# Altium schematic symbol library AA_Symbols.SchLib: 1017 symbols (part 4 of 7) (continued)
## IC_OPA4376AIPW
designator U?, comment OPA4376AIPW
IC, Quad Op-amp, Precision, Low Noise, Low Quiescent Current; Manufacturer: Texas Instruments; Manufacturer P/N: OPA4376AIPWR; Outset P/N: 0000143
footprint TSSOP_14PIN (TSSOP, 14-Leads, Body 5.1x4.5mm (max), Pitch 0.65mm, IPC Medium Density)
part A pins: 1 Aout, 2 -A, 3 +A
part B pins: 5 +B, 6 -B, 7 Bout
part C pins: 8 Cout, 9 -C, 10 +C
part D pins: 12 +D, 13 -D, 14 Dout
part E pins: 4 V+ (power), 11 V- (power)

## IC_PCM5100APWR
designator U?, comment PCM5100APWR
IC, Audio DAC, 16-32b, I2S, 20-TSSOP; Manufacturer: Texas Instruments; Outset P/N: PN-0008408; Manufacturer P/N: PCM5100APWR
footprint SOP20P65_650X640X120L62X24N (PW_MO-153) (Small Outline Pkg (SOP), 0.65 mm pitch; 20 pin, 6.50 mm L X 4.40 mm W X 1.20 mm H body)
pins: 1 CPVDD (power), 2 CAPP (out), 3 CPGND (power), 4 CAPM (out), 5 VNEG (out), 6 OUTL (out), 7 OUTR (out), 8 AVDD (power), 9 AGND (power), 10 DEMP (in), 11 FLT (in), 12 SCK (in), 13 BCK (in), 14 DIN (in), 15 LRCLK (in), 16 FMT (in), 17 XSMT (in), 18 LDOO (power), 19 DGND (power), 20 DVDD (power)

## IC_R3119N120A-TR-FE
designator U?, comment R3119N120A-TR-FE
IC, Supervisor Open Drain or Open Collector 1 Channel SOT-23-5; Manufacturer: Nisshinbo Micro Devices Inc.; Value: R3119N120A-TR-FE; Manufacturer P/N: R3119N120A-TR-FE
pins: 1 VDD (power) "BIAS", 2 GND (power) "VCC", 3 GND (power), 4 DOUT (out) "CH A", 5 CD (in) "CH B"

## IC_SN65HVD31DR
designator U?, comment SN65HVD31DR
IC, RS-485 Driver and Receiver, 5Mbps; Manufacturer: Texas Instruments; Value: SN65HVD31DR; Manufacturer P/N: SN65HVD31DR
footprint SOIC8P127_490X599X175L84X41N (D_MS-012AA)
pins: 1 VCC (power), 2 R (out), 3 D (in), 4 GND (power), 5 Y (out), 6 Z (out), 7 B (in), 8 A (in)

## IC_SN65HVD32DR
designator U?, comment SN65HVD32DR
IC, RS-485 Driver and Receiver; Manufacturer: Texas Instruments; Outset P/N: 0008129; Value: SN65HVD32DR; Manufacturer P/N: SN65HVD32DR
footprint SOIC8P127_490X599X175L84X41N (D_MS-012AA)
pins: 1 VCC (power), 2 R (out), 3 D (in), 4 GND (power), 5 Y (out), 6 Z (out), 7 B (in), 8 A (in)

## IC_SN65HVD33DR
designator U?, comment SN65HVD33DR
IC TRANSCEIVER FULL 1/1 14SOIC; Manufacturer: Teaxas Instruments; Outset P/N: PN-0008336; TEMPERATURE: -40°C ~ 85°C; Manufacturer P/N: SN65HVD33DR; VALUE: SN65HVD33DR
footprint SOIC14P127_865X600X175L83X41N (D_MS-012AB)
pins: 1 NC, 2 R (out), 3 ~{RE} (in), 4 DE (in), 5 D (in), 6 GND (power), 7 GND (power), 8 NC, 9 Y (out), 10 ~{Z} (out), 11 ~{B} (in), 12 A (in), 13 VCC (power), 14 VCC (power)

## IC_SN65HVD35DR
designator U?, comment SN65HVD35DR
IC, RS-485 Driver and Receiver; Manufacturer: Texas Instruments; Outset P/N: 0000146; Manufacturer P/N: SN65HVD35DR
footprint SOIC_14PIN
pins: 1 NC (in) hidden, 2 R (out), 3 /RE (in), 4 DE (in), 5 D (in), 6 GND (power), 7 GND (power), 9 Y (out), 10 Z (out), 11 B (in), 12 A (in), 13 VCC (power), 14 VCC (power)
text: RS-485 Tx/Rx; +3.3V

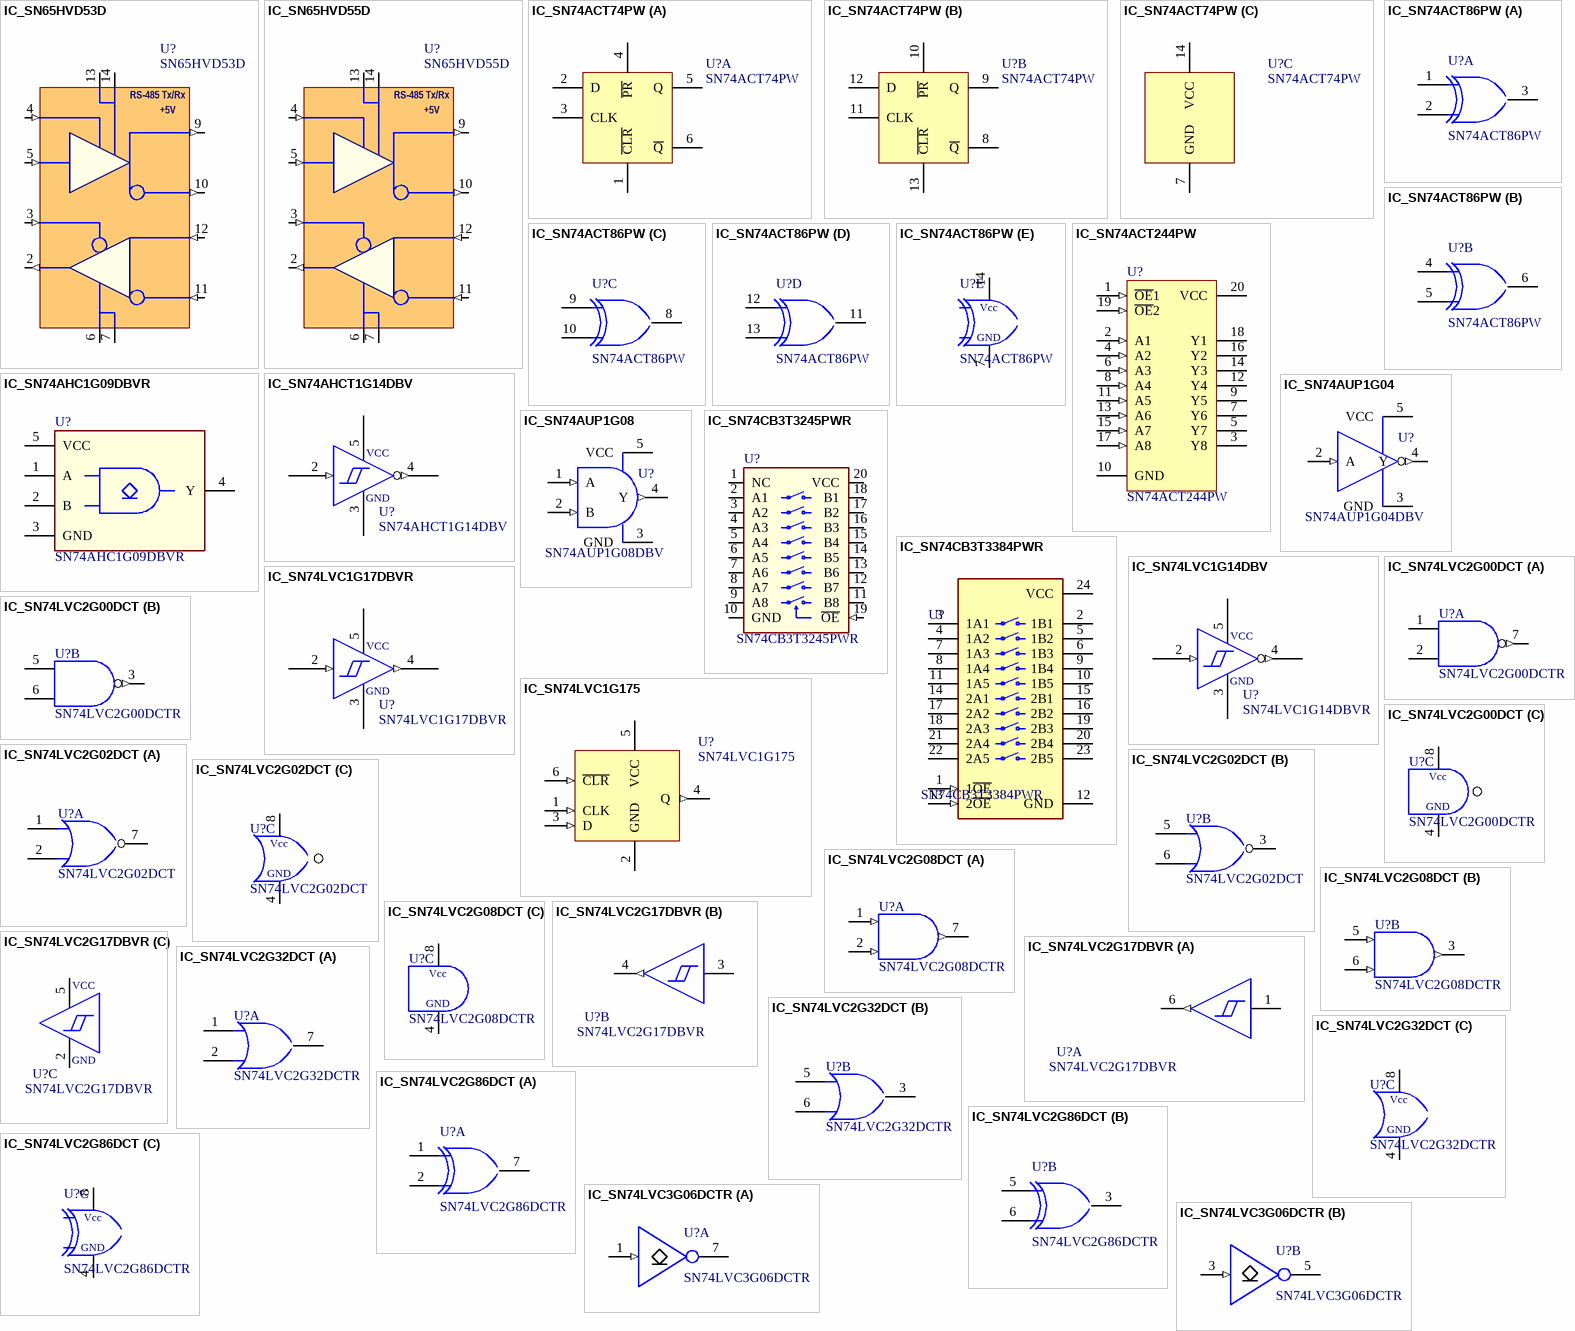
[diagram p23: symbols IC_SN65HVD53D to IC_SN74LVC3G06DCTR]

## IC_SN65HVD53D
designator U?, comment SN65HVD53D
IC, RS-485 Driver and Receiver 5V; Manufacturer: Texas Instruments; Outset P/N: 0000147; Manufacturer P/N: SN65HVD53D
footprint SOIC_14PIN
pins: 1 NC (in) hidden, 2 R (out), 3 /RE (in), 4 DE (in), 5 D (in), 6 GND (power), 7 GND (power), 9 Y (out), 10 Z (out), 11 B (in), 12 A (in), 13 VCC (power), 14 VCC (power)
text: RS-485 Tx/Rx; +5V

## IC_SN65HVD55D
designator U?, comment SN65HVD55D
IC, RS-485 Driver and Receiver 5V, 1Mbps Rate; Manufacturer: Texas Instruments; Outset P/N: PN-0005562; Manufacturer P/N: SN65HVD55D
footprint SOIC_14PIN
pins: 1 NC (in) hidden, 2 R (out), 3 /RE (in), 4 DE (in), 5 D (in), 6 GND (power), 7 GND (power), 9 Y (out), 10 Z (out), 11 B (in), 12 A (in), 13 VCC (power), 14 VCC (power)
text: RS-485 Tx/Rx; +5V

## IC_SN74ACT74PW
designator U?, comment SN74ACT74PW
IC, Flip-Flop, D-Type, Dual, Positive-Edge Triggered; Manufacturer: Texas Instruments; Manufacturer P/N: SN74ACT74PWR; Outset P/N: 0000149
footprint TSSOP_14PIN (TSSOP, 14-Leads, Body 5.1x4.5mm (max), Pitch 0.65mm, IPC Medium Density)
part A pins: 1 ~{CLR}, 2 D, 3 CLK, 4 ~{PR}, 5 Q, 6 ~{Q}
part B pins: 8 ~{Q}, 9 Q, 10 ~{PR}, 11 CLK, 12 D, 13 ~{CLR}
part C pins: 7 GND, 14 VCC

## IC_SN74ACT86PW
designator U?, comment SN74ACT86PW
IC, 2-Input XOR Gate, Quad; Manufacturer: Texas Instruments; Manufacturer P/N: SN74ACT86PWR; Outset P/N: 0000150
footprint TSSOP_14PIN (TSSOP, 14-Leads, Body 5.1x4.5mm (max), Pitch 0.65mm, IPC Medium Density)
part A pins: 1 A, 2 B, 3 Y
part B pins: 4 A, 5 B, 6 Y
part C pins: 8 Y, 9 A, 10 B
part D pins: 11 Y, 12 A, 13 B
part E pins: 7 GND (power), 14 VCC (power)
part E text: Vcc

## IC_SN74ACT244PW
designator U?, comment SN74ACT244PW
IC, Octal Buffer/Driver with 3-State Outputs; Manufacturer: Texas Instruments; Outset P/N: 0000148; Manufacturer P/N: SN74ACT244PW
footprint TSSOP_20PIN
pins: 1 ~{OE}1 (in), 2 A1 (in), 3 Y8 (hiz), 4 A2 (in), 5 Y7 (hiz), 6 A3 (in), 7 Y6 (hiz), 8 A4 (in), 9 Y5 (hiz), 10 GND (power), 11 A5 (in), 12 Y4 (hiz), 13 A6 (in), 14 Y3 (hiz), 15 A7 (in), 16 Y2 (hiz), 17 A8 (in), 18 Y1 (hiz), 19 ~{OE}2 (in), 20 VCC (power)

## IC_SN74AHC1G09DBVR
designator U?, comment SN74AHC1G09DBVR
IC, AND Gate IC 1 Channel Open Drain SOT-23-5; Manufacturer: Texas Instruments; Outset P/N: PN-0002781; Manufacturer P/N: SN74AHC1G09DBVR; Value: SN74AHC1G09DBVR
footprint SOT23_5PIN (SOT23, 5-Leads, Body 3.0x3.0mm (max), Pitch 0.95mm, IPC Medium Density)
pins: 1 A, 2 B, 3 GND (power), 4 Y, 5 VCC (power)

## IC_SN74AHCT1G14DBV
designator U?, comment SN74AHCT1G14DBV
IC, Schmitt-Trigger Inverter, ACHT; Manufacturer: Texas Instruments; Manufacturer P/N: SN74AHCT1G14DBVR; Outset P/N: 0000151
footprint SOT23_5PIN (SOT23, 5-Leads, Body 3.0x3.0mm (max), Pitch 0.95mm, IPC Medium Density)
pins: 1 NC (in) hidden, 2 A (in), 3 GND (power), 4 Y (out), 5 VCC (power)

## IC_SN74AUP1G04
designator U?, comment SN74AUP1G04DBV
IC, Single, INV, Low Power; Manufacturer: Texas Instruments; Outset P/N: PN-0002760; Manufacturer P/N: SN74AUP1G04DBV; Value: SN74AUP1G04DBV
footprint SOT23_5PIN (SOT23, 5-Leads, Body 3.0x3.0mm (max), Pitch 0.95mm, IPC Medium Density)
pins: 2 A (in), 3 GND (power), 4 Y (out), 5 VCC (power)

## IC_SN74AUP1G08
designator U?, comment SN74AUP1G08DBV
IC, Single, 2-In, AND, Low Power; Manufacturer: Texas Instruments; Outset P/N: PN-0002761; Manufacturer P/N: SN74AUP1G08DBV; Value: SN74AUP1G08DBV
footprint SOT23_5PIN (SOT23, 5-Leads, Body 3.0x3.0mm (max), Pitch 0.95mm, IPC Medium Density)
pins: 1 A (in), 2 B (in), 3 GND (power), 4 Y (out), 5 VCC (power)

## IC_SN74CB3T3245PWR
designator U?, comment SN74CB3T3245PWR
IC, Bus Switch, Octal, SN74CB3T3245PWR, 20-TSSOP; Manufacturer: Texas Instruments; Outset P/N: PN-0001788; Value: SN74CB3T3245PWR; Manufacturer P/N: SN74CB3T3245PWR
footprint SN74CB3T3245PW_SOP65P640X120-20N (SOP,0.65mm,pitch;20 pin,4.40mm W X 6.50mm L X 1.20mm H body)
pins: 1 NC, 2 A1, 3 A2, 4 A3, 5 A4, 6 A5, 7 A6, 8 A7, 9 A8, 10 GND (power), 11 B8, 12 B7, 13 B6, 14 B5, 15 B4, 16 B3, 17 B2, 18 B1, 19 ~{OE} (in), 20 VCC (power)

## IC_SN74CB3T3384PWR
designator U?, comment SN74CB3T3384PWR
IC, Bus Switch, 10-ch, 24-TSSOP; Manufacturer: Texas Instruments; Value: SN74CB3T3384PWR; Manufacturer P/N: SN74CB3T3384PWR
footprint SOP24P65_780X640X120L62X24N (PW_MO-153) (Small Outline Pkg (SOP), 0.65 mm pitch; 24 pin, 7.80 mm L X 4.40 mm W X 1.20 mm H body)
pins: 1 1~{OE} (in), 2 1B1, 3 1A1, 4 1A2, 5 1B2, 6 1B3, 7 1A3, 8 1A4, 9 1B4, 10 1B5, 11 1A5, 12 GND (power), 13 2~{OE} (in), 14 2A1, 15 2B1, 16 2B2, 17 2A2, 18 2A3, 19 2B3, 20 2B4, 21 2A4, 22 2A5, 23 2B5, 24 VCC (power)

## IC_SN74LVC1G14DBV
designator U?, comment SN74LVC1G14DBVR
IC, Schmitt-Trigger Inverter; Manufacturer: Texas Instruments; Outset P/N: 0000153; Manufacturer P/N: SN74LVC1G14DBVR
footprint SOT23_5PIN (SOT23, 5-Leads, Body 3.0x3.0mm (max), Pitch 0.95mm, IPC Medium Density)
pins: 1 NC (in) hidden, 2 A (in), 3 GND (power), 4 Y (out), 5 VCC (power)

## IC_SN74LVC1G17DBVR
designator U?, comment SN74LVC1G17DBVR
IC, Schmitt-Trigger Non-Inverting, ACHT; Manufacturer: Texas Instruments; Outset P/N: PN-0002755; Manufacturer P/N: SN74LVC1G17DBVR; Value: SN74LVC1G17DBVR
footprint SOT23_5PIN (SOT23, 5-Leads, Body 3.0x3.0mm (max), Pitch 0.95mm, IPC Medium Density)
pins: 1 NC (in) hidden, 2 A (in), 3 GND (power), 4 Y (out), 5 VCC (power)

## IC_SN74LVC1G175
designator U?, comment SN74LVC1G175
IC, Flip-Flop, D-Type, Single with Asynchronous Clear; Manufacturer: Texas Instruments; Outset P/N: PN-0004042; Manufacturer P/N: SN74LVC1G175
footprint SOT23_6PIN (Small Outline; 6 Leads; Body 3.6 x 3.6 mm, inc. leads (LxW max))
pins: 1 CLK (in), 2 GND, 3 D (in), 4 Q (out), 5 VCC, 6 ~{CLR} (in)

## IC_SN74LVC2G00DCT
designator U?, comment SN74LVC2G00DCTR
IC, 2-Input NAND Gate, Dual; Manufacturer: Texas Instruments; Outset P/N: 0000155; Manufacturer P/N: SN74LVC2G00DCTR
footprint DCT8
part A pins: 1 A, 2 B, 7 Y (out)
part B pins: 3 Y (out), 5 A, 6 B
part C pins: 4 GND (power), 8 VCC (power)
part C text: Vcc

## IC_SN74LVC2G02DCT
designator U?, comment SN74LVC2G02DCT
IC, 2-Input NOR Gate, Dual; Manufacturer: Texas Instruments; Manufacturer P/N: SN74LVC2G02DCTR; Outset P/N: 0000156
footprint DCT8
part A pins: 1 A, 2 B, 7 Y
part B pins: 3 Y, 5 A, 6 B
part C pins: 4 GND, 8 VCC
part C text: Vcc

## IC_SN74LVC2G08DCT
designator U?, comment SN74LVC2G08DCTR
IC, 2-Input AND Gate, Dual; Manufacturer: Texas Instruments; Outset P/N: 0000157; Manufacturer P/N: SN74LVC2G08DCTR
footprint DCT8
part A pins: 1 A (in), 2 B (in), 7 Y (out)
part B pins: 3 Y (out), 5 A (in), 6 B (in)
part C pins: 4 GND (power), 8 VCC (power)
part C text: Vcc

## IC_SN74LVC2G17DBVR
designator U?, comment SN74LVC2G17DBVR
IC, Dual Buffer Schmitt Trigger; Manufacturer: Texas Instruments; Outset P/N: 0000158; Manufacturer P/N: SN74LVC2G17DBVR
footprint SOT23_6PIN (Small Outline; 6 Leads; Body 3.6 x 3.6 mm, inc. leads (LxW max))
part A pins: 1 1A, 6 1Y (out)
part B pins: 3 2A, 4 2Y (out)
part C pins: 2 GND (power), 5 VCC (power)

## IC_SN74LVC2G32DCT
designator U?, comment SN74LVC2G32DCTR
IC, 2-Input OR Gate, Dual; Manufacturer: Texas Instruments; Outset P/N: 0000159; Manufacturer P/N: SN74LVC2G32DCTR
footprint DCT8
part A pins: 1 A, 2 B, 7 Y
part B pins: 3 Y, 5 A, 6 B
part C pins: 4 GND, 8 VCC
part C text: Vcc

## IC_SN74LVC2G86DCT
designator U?, comment SN74LVC2G86DCTR
IC, Dual 2-Input Exclusive-OR Gate; Manufacturer: Texas Instruments; Outset P/N: 0000160; Manufacturer P/N: SN74LVC2G86DCTR
footprint DCT8
part A pins: 1 A, 2 B, 7 Y
part B pins: 3 Y, 5 A, 6 B
part C pins: 4 GND (power), 8 VCC (power)
part C text: Vcc

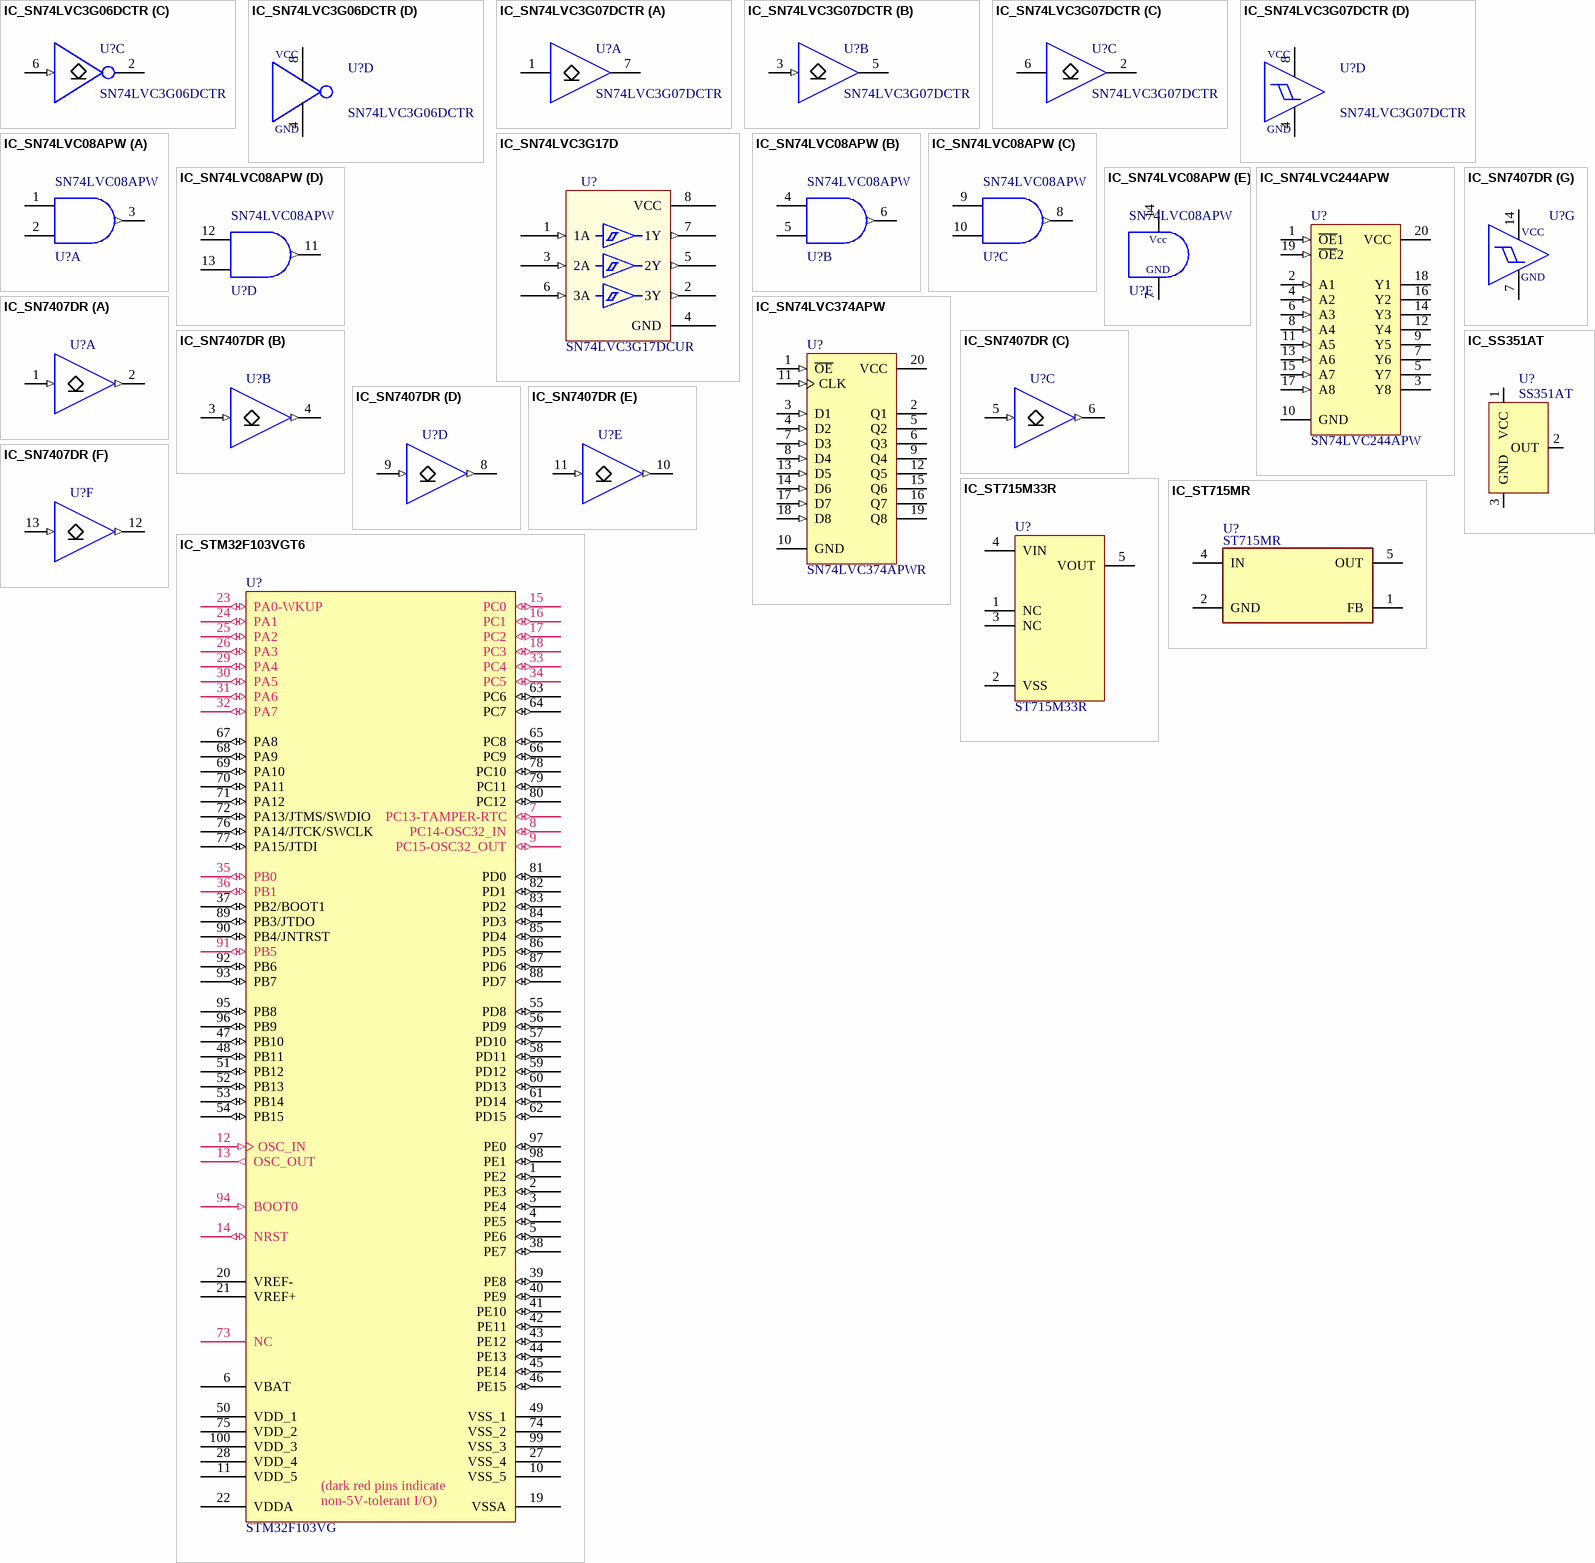
[diagram p24: symbols IC_SN74LVC3G06DCTR to IC_STM32F103VGT6]

## IC_SN74LVC3G06DCTR
designator U?, comment SN74LVC3G06DCTR
IC, Buffer, Inverting, Tri, Open Drain, SN74LVC3G06DCTR, SM8; Manufacturer: Texas Instruments; Outset P/N: PN-0001787; Manufacturer P/N: SN74LVC3G06DCTR
footprint SN74LVC3G07DCTR_SOP65P400X130-8L40N (Small Outline Pkg (SOP), 0.65 mm pitch; 8 pin, 2.95 mm L X 2.80 mm W X 1.30 mm H body)
part A pins: 1 1A (in), 7 1Y (oc)
part B pins: 3 2A (in), 5 2Y (oc)
part C pins: 2 3Y (oc), 6 3A (in)
part D pins: 4 GND (power), 8 VCC (power)
1 alternate drawing of the same symbol

## IC_SN74LVC3G07DCTR
designator U?, comment SN74LVC3G07DCTR
IC, Buffer, Tri, Open Drain, SN74LVC3G07DCTR, SM8; Manufacturer: Texas Instruments; Outset P/N: PN-0001728; Manufacturer P/N: SN74LVC3G07DCTR
footprint SN74LVC3G07DCTR_SOP65P400X130-8L40N (Small Outline Pkg (SOP), 0.65 mm pitch; 8 pin, 2.95 mm L X 2.80 mm W X 1.30 mm H body)
part A pins: 1 1A, 7 1Y (oc)
part B pins: 3 2A (in), 5 2Y (oc)
part C pins: 2 3Y (oc), 6 3A
part D pins: 4 GND (power), 8 VCC (power)
1 alternate drawing of the same symbol

## IC_SN74LVC3G17D
designator U?, comment SN74LVC3G17DCUR
IC, Triple Schmidt Trigger Buffer, SN74LVC3G17DCUR, US8; Manufacturer: TI; Outset P/N: PN-0001689; Manufacturer P/N: SN74LVC3G17DCUR; Value: SN74LVC3G17DCUR
footprint SN74LVC3G17D_SOP50P310X90-8N (MO-187CA) (SOP,0.50mm,pitch;8 pin,2.30mm W X 2.00mm L X 0.90mm H body)
pins: 1 1A (in), 2 3Y (out), 3 2A (in), 4 GND (power), 5 2Y (out), 6 3A (in), 7 1Y (out), 8 VCC (power)

## IC_SN74LVC08APW
designator U?, comment SN74LVC08APW
IC, Quadruple 2-Input Positive-AND Gate; Manufacturer: Texas Instruments; Outset P/N: 0000152; Manufacturer P/N: SN74LVC08APW
footprint TSSOP_14PIN (TSSOP, 14-Leads, Body 5.1x4.5mm (max), Pitch 0.65mm, IPC Medium Density)
part A pins: 1 A, 2 B, 3 Y (out)
part B pins: 4 A, 5 B, 6 Y (out)
part C pins: 8 Y (out), 9 A, 10 B
part D pins: 11 Y (out), 12 A, 13 B
part E pins: 7 GND (power), 14 VCC (power)
part E text: Vcc

## IC_SN74LVC244APW
designator U?, comment SN74LVC244APW
IC, Octal Buffer/Driver with 3-State Outputs; Manufacturer: Texas Instruments; Manufacturer P/N: SN74LVC244APWR; Outset P/N: 0000154
footprint TSSOP_20PIN
pins: 1 ~{OE}1 (in), 2 A1 (in), 3 Y8 (hiz), 4 A2 (in), 5 Y7 (hiz), 6 A3 (in), 7 Y6 (hiz), 8 A4 (in), 9 Y5 (hiz), 10 GND (power), 11 A5 (in), 12 Y4 (hiz), 13 A6 (in), 14 Y3 (hiz), 15 A7 (in), 16 Y2 (hiz), 17 A8 (in), 18 Y1 (hiz), 19 ~{OE}2 (in), 20 VCC (power)

## IC_SN74LVC374APW
designator U?, comment SN74LVC374APWR
IC, Octal D-Type Edge-Triggered Flip-Flop with 3-State Outputs; Manufacturer: Texas Instruments; Outset P/N: 0000161; Manufacturer P/N: SN74LVC374APWR
footprint TSSOP_20PIN
pins: 1 ~{OE} (in), 2 Q1 (hiz), 3 D1 (in), 4 D2 (in), 5 Q2 (hiz), 6 Q3 (hiz), 7 D3 (in), 8 D4 (in), 9 Q4 (hiz), 10 GND (power), 11 CLK (in), 12 Q5 (hiz), 13 D5 (in), 14 D6 (in), 15 Q6 (hiz), 16 Q7 (hiz), 17 D7 (in), 18 D8 (in), 19 Q8 (hiz), 20 VCC (power)

## IC_SN7407DR
designator U?, comment SN7407DR  (value not drawn)
IC, Buffer, Hex, Open-collector, SN7407DR, SOIC; Manufacturer: Texas Instruments; Outset P/N: PN-0001730; ClassName: *; Manufacturer P/N: SN7407DR; NOSTUFF: *; Value: SN7407DR
footprint SN7407DR _SOIC127P600X175-14L87N (Small Outline IC (SOIC), 1.27 mm pitch; 14 pin, 8.65 mm L X 3.90 mm W X 1.75 mm H body)
part A pins: 1 1A (in), 2 1Y (out)
part B pins: 3 2A (in), 4 2Y (out)
part C pins: 5 3A (in), 6 3Y (out)
part D pins: 8 4Y (out), 9 4A (in)
part E pins: 10 5Y (out), 11 5A (in)
part F pins: 12 6Y (out), 13 6A (in)
part G pins: 7 GND (power), 14 VCC (power)

## IC_SS351AT
designator U?, comment SS351AT
IC, Hall Effect Sensor, SOT-23; Manufacturer: Honeywell; Outset P/N: 0000162; Manufacturer P/N: SS351AT
footprint SOT-23 (SOT-23; 3 Leads; Body 3.0 x 2.6 mm, inc. leads (LxW max))
pins: 1 VCC, 2 OUT, 3 GND

## IC_ST715M33R
designator U?, comment ST715M33R
IC, Voltage Regulator, 3.3V LDO, 85mA, 24 Vin; Manufacturer: STMicroelectronics; Outset P/N: 0000163; Manufacturer P/N: ST715M33R
footprint SOT23_5PIN (SOT23, 5-Leads, Body 3.0x3.0mm (max), Pitch 0.95mm, IPC Medium Density)
pins: 1 NC "BIAS", 2 VSS "CH A", 3 NC "CH B", 4 VIN "Clock", 5 VOUT "GND"

## IC_ST715MR
designator U?, comment ST715MR
IC, Linear Voltage Regulator IC Positive Adjustable 1 Output 85mA SOT-23-5; Manufacturer: STMicroelectronics; Outset P/N: PN-0007201; Manufacturer P/N: ST715MR; VALUE: ST715MR
footprint SOT23-5P95_280X145L45X40N (527AH_MO-178)
pins: 1 FB, 2 GND (power), 4 IN (power), 5 OUT (power)

## IC_STM32F103VGT6
designator U?, comment STM32F103VG
IC, STM32 ARM-based 32-bit MC, STM32F103VG; Manufacturer: ST Micro; Manufacturer P/N: STM32F103VGT6; Outset P/N: 0000164
footprint LQFP100_N (Thin QFP, 100-Leads, Body 14x14mm, Pitch 0.5mm, IPC Medium Density)
pins: 1 PE2 (io), 2 PE3 (io), 3 PE4 (io), 4 PE5 (io), 5 PE6 (io), 6 VBAT (power), 7 PC13-TAMPER-RTC (io), 8 PC14-OSC32_IN (io), 9 PC15-OSC32_OUT (io), 10 VSS_5 (power), 11 VDD_5 (power), 12 OSC_IN (in), 13 OSC_OUT (out), 14 NRST (io), 15 PC0 (io), 16 PC1 (io), 17 PC2 (io), 18 PC3 (io), 19 VSSA (power), 20 VREF- (power), 21 VREF+ (power), 22 VDDA (power), 23 PA0-WKUP (io), 24 PA1 (io), 25 PA2 (io), 26 PA3 (io), 27 VSS_4 (power), 28 VDD_4 (power), 29 PA4 (io), 30 PA5 (io), 31 PA6 (io), 32 PA7 (io), 33 PC4 (io), 34 PC5 (io), 35 PB0 (io), 36 PB1 (io), 37 PB2/BOOT1 (io), 38 PE7 (io), 39 PE8 (io), 40 PE9 (io), 41 PE10 (io), 42 PE11 (io), 43 PE12 (io), 44 PE13 (io), 45 PE14 (io), 46 PE15 (io), 47 PB10 (io), 48 PB11 (io), 49 VSS_1 (power), 50 VDD_1 (power), 51 PB12 (io), 52 PB13 (io), 53 PB14 (io), 54 PB15 (io), 55 PD8 (io), 56 PD9 (io), 57 PD10 (io), 58 PD11 (io), 59 PD12 (io), 60 PD13 (io), 61 PD14 (io), 62 PD15 (io), 63 PC6 (io), 64 PC7 (io), 65 PC8 (io), 66 PC9 (io), 67 PA8 (io), 68 PA9 (io), 69 PA10 (io), 70 PA11 (io), 71 PA12 (io), 72 PA13/JTMS/SWDIO (io), 73 NC, 74 VSS_2 (power), 75 VDD_2 (power), 76 PA14/JTCK/SWCLK (io), 77 PA15/JTDI (io), 78 PC10 (io), 79 PC11 (io), 80 PC12 (io), 81 PD0 (io), 82 PD1 (io), 83 PD2 (io), 84 PD3 (io), 85 PD4 (io), 86 PD5 (io), 87 PD6 (io), 88 PD7 (io), 89 PB3/JTDO (io), 90 PB4/JNTRST (io), 91 PB5 (io), 92 PB6 (io), 93 PB7 (io), 94 BOOT0 (in), 95 PB8 (io), 96 PB9 (io), 97 PE0 (io), 98 PE1 (io), 99 VSS_3 (power), 100 VDD_3 (power)
text: (dark red pins indicate / non-5V-tolerant I/O)

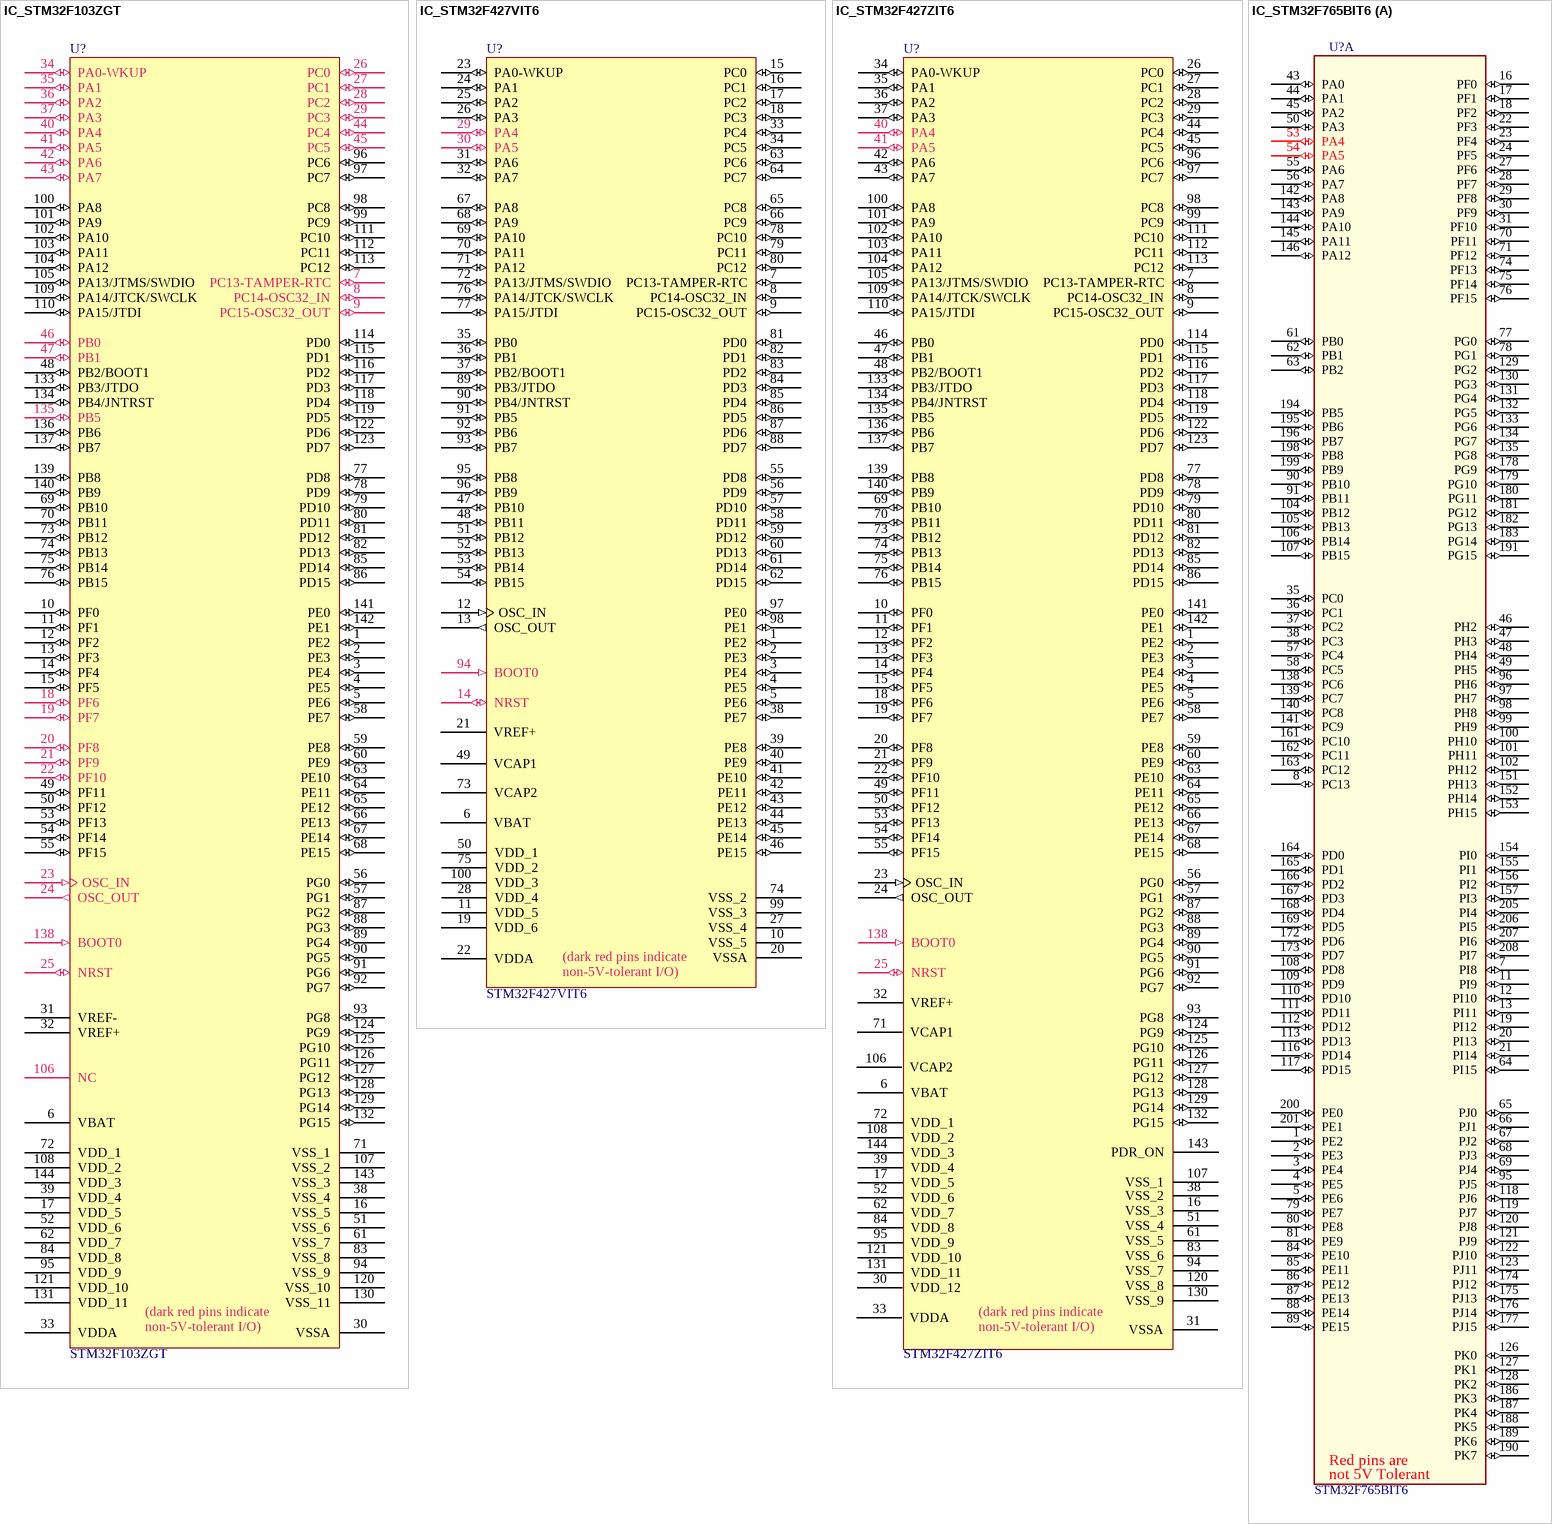
[diagram p25: symbols IC_STM32F103ZGT to IC_STM32F765BIT6]

## IC_STM32F103ZGT
designator U?, comment STM32F103ZGT
IC, STM32 ARM-based 32-bit MCU with 1MB Flash, 144-pin LQFP; Manufacturer: STMicroelectronics; Manufacturer P/N: STM32F103ZGT6; Outset P/N: 0000165
footprint LQFP144_N (Thin QFP, 144-Leads, Body 20x20mm, Pitch 0.5mm, IPC Medium Density)
pins: 1 PE2 (io), 2 PE3 (io), 3 PE4 (io), 4 PE5 (io), 5 PE6 (io), 6 VBAT (power), 7 PC13-TAMPER-RTC (io), 8 PC14-OSC32_IN (io), 9 PC15-OSC32_OUT (io), 10 PF0 (io), 11 PF1 (io), 12 PF2 (io), 13 PF3 (io), 14 PF4 (io), 15 PF5 (io), 16 VSS_5 (power), 17 VDD_5 (power), 18 PF6 (io), 19 PF7 (io), 20 PF8 (io), 21 PF9 (io), 22 PF10 (io), 23 OSC_IN (in), 24 OSC_OUT (out), 25 NRST (io), 26 PC0 (io), 27 PC1 (io), 28 PC2 (io), 29 PC3 (io), 30 VSSA (power), 31 VREF- (power), 32 VREF+ (power), 33 VDDA (power), 34 PA0-WKUP (io), 35 PA1 (io), 36 PA2 (io), 37 PA3 (io), 38 VSS_4 (power), 39 VDD_4 (power), 40 PA4 (io), 41 PA5 (io), 42 PA6 (io), 43 PA7 (io), 44 PC4 (io), 45 PC5 (io), 46 PB0 (io), 47 PB1 (io), 48 PB2/BOOT1 (io), 49 PF11 (io), 50 PF12 (io), 51 VSS_6 (power), 52 VDD_6 (power), 53 PF13 (io), 54 PF14 (io), 55 PF15 (io), 56 PG0 (io), 57 PG1 (io), 58 PE7 (io), 59 PE8 (io), 60 PE9 (io), 61 VSS_7 (power), 62 VDD_7 (power), 63 PE10 (io), 64 PE11 (io), 65 PE12 (io), 66 PE13 (io), 67 PE14 (io), 68 PE15 (io), 69 PB10 (io), 70 PB11 (io), 71 VSS_1 (power), 72 VDD_1 (power), 73 PB12 (io), 74 PB13 (io), 75 PB14 (io), 76 PB15 (io), 77 PD8 (io), 78 PD9 (io), 79 PD10 (io), 80 PD11 (io), 81 PD12 (io), 82 PD13 (io), 83 VSS_8 (power), 84 VDD_8 (power), 85 PD14 (io), 86 PD15 (io), 87 PG2 (io), 88 PG3 (io), 89 PG4 (io), 90 PG5 (io), 91 PG6 (io), 92 PG7 (io), 93 PG8 (io), 94 VSS_9 (power), 95 VDD_9 (power), 96 PC6 (io), 97 PC7 (io), 98 PC8 (io), 99 PC9 (io), 100 PA8 (io), 101 PA9 (io), 102 PA10 (io), 103 PA11 (io), 104 PA12 (io), 105 PA13/JTMS/SWDIO (io), 106 NC, 107 VSS_2 (power), 108 VDD_2 (power), 109 PA14/JTCK/SWCLK (io), 110 PA15/JTDI (io), 111 PC10 (io), 112 PC11 (io), 113 PC12 (io), 114 PD0 (io), 115 PD1 (io), 116 PD2 (io), 117 PD3 (io), 118 PD4 (io), 119 PD5 (io), 120 VSS_10 (power), 121 VDD_10 (power), 122 PD6 (io), 123 PD7 (io), 124 PG9 (io), 125 PG10 (io), 126 PG11 (io), 127 PG12 (io), 128 PG13 (io), 129 PG14 (io), 130 VSS_11 (power), 131 VDD_11 (power), 132 PG15 (io), 133 PB3/JTDO (io), 134 PB4/JNTRST (io), 135 PB5 (io), 136 PB6 (io), 137 PB7 (io), 138 BOOT0 (in), 139 PB8 (io), 140 PB9 (io), 141 PE0 (io), 142 PE1 (io), 143 VSS_3 (power), 144 VDD_3 (power)
text: (dark red pins indicate / non-5V-tolerant I/O)

## IC_STM32F427VIT6
designator U?, comment STM32F427VIT6
IC, STM32 ARM-based 32-bit MC, STM32F427VIT6; Manufacturer: ST Micro; Outset P/N: PN-0006183; Manufacturer P/N: STM32F427VIT6
footprint LQFP100_N (Thin QFP, 100-Leads, Body 14x14mm, Pitch 0.5mm, IPC Medium Density)
pins: 1 PE2 (io), 2 PE3 (io), 3 PE4 (io), 4 PE5 (io), 5 PE6 (io), 6 VBAT (power), 7 PC13-TAMPER-RTC (io), 8 PC14-OSC32_IN (io), 9 PC15-OSC32_OUT (io), 10 VSS_5 (power), 11 VDD_5 (power), 12 OSC_IN (in), 13 OSC_OUT (out), 14 NRST (io), 15 PC0 (io), 16 PC1 (io), 17 PC2 (io), 18 PC3 (io), 19 VDD_6 (power), 20 VSSA (power), 21 VREF+ (power), 22 VDDA (power), 23 PA0-WKUP (io), 24 PA1 (io), 25 PA2 (io), 26 PA3 (io), 27 VSS_4 (power), 28 VDD_4 (power), 29 PA4 (io), 30 PA5 (io), 31 PA6 (io), 32 PA7 (io), 33 PC4 (io), 34 PC5 (io), 35 PB0 (io), 36 PB1 (io), 37 PB2/BOOT1 (io), 38 PE7 (io), 39 PE8 (io), 40 PE9 (io), 41 PE10 (io), 42 PE11 (io), 43 PE12 (io), 44 PE13 (io), 45 PE14 (io), 46 PE15 (io), 47 PB10 (io), 48 PB11 (io), 49 VCAP1 (power), 50 VDD_1 (power), 51 PB12 (io), 52 PB13 (io), 53 PB14 (io), 54 PB15 (io), 55 PD8 (io), 56 PD9 (io), 57 PD10 (io), 58 PD11 (io), 59 PD12 (io), 60 PD13 (io), 61 PD14 (io), 62 PD15 (io), 63 PC6 (io), 64 PC7 (io), 65 PC8 (io), 66 PC9 (io), 67 PA8 (io), 68 PA9 (io), 69 PA10 (io), 70 PA11 (io), 71 PA12 (io), 72 PA13/JTMS/SWDIO (io), 73 VCAP2, 74 VSS_2 (power), 75 VDD_2 (power), 76 PA14/JTCK/SWCLK (io), 77 PA15/JTDI (io), 78 PC10 (io), 79 PC11 (io), 80 PC12 (io), 81 PD0 (io), 82 PD1 (io), 83 PD2 (io), 84 PD3 (io), 85 PD4 (io), 86 PD5 (io), 87 PD6 (io), 88 PD7 (io), 89 PB3/JTDO (io), 90 PB4/JNTRST (io), 91 PB5 (io), 92 PB6 (io), 93 PB7 (io), 94 BOOT0 (in), 95 PB8 (io), 96 PB9 (io), 97 PE0 (io), 98 PE1 (io), 99 VSS_3 (power), 100 VDD_3 (power)
text: (dark red pins indicate / non-5V-tolerant I/O)

## IC_STM32F427ZIT6
designator U?, comment STM32F427ZIT6
IC, STM32 ARM-based 32-bit MCU with 2 MB Flash, 144-pin LQFP; Manufacturer: STMicroelectronics; Outset P/N: PN-0006207; Manufacturer P/N: STM32F427ZIT6
footprint LQFP144_N (Thin QFP, 144-Leads, Body 20x20mm, Pitch 0.5mm, IPC Medium Density)
pins: 1 PE2 (io), 2 PE3 (io), 3 PE4 (io), 4 PE5 (io), 5 PE6 (io), 6 VBAT (power), 7 PC13-TAMPER-RTC (io), 8 PC14-OSC32_IN (io), 9 PC15-OSC32_OUT (io), 10 PF0 (io), 11 PF1 (io), 12 PF2 (io), 13 PF3 (io), 14 PF4 (io), 15 PF5 (io), 16 VSS_3 (power), 17 VDD_5 (power), 18 PF6 (io), 19 PF7 (io), 20 PF8 (io), 21 PF9 (io), 22 PF10 (io), 23 OSC_IN (in), 24 OSC_OUT (out), 25 NRST (io), 26 PC0 (io), 27 PC1 (io), 28 PC2 (io), 29 PC3 (io), 30 VDD_12 (power), 31 VSSA (power), 32 VREF+ (power), 33 VDDA (power), 34 PA0-WKUP (io), 35 PA1 (io), 36 PA2 (io), 37 PA3 (io), 38 VSS_2 (power), 39 VDD_4 (power), 40 PA4 (io), 41 PA5 (io), 42 PA6 (io), 43 PA7 (io), 44 PC4 (io), 45 PC5 (io), 46 PB0 (io), 47 PB1 (io), 48 PB2/BOOT1 (io), 49 PF11 (io), 50 PF12 (io), 51 VSS_4 (power), 52 VDD_6 (power), 53 PF13 (io), 54 PF14 (io), 55 PF15 (io), 56 PG0 (io), 57 PG1 (io), 58 PE7 (io), 59 PE8 (io), 60 PE9 (io), 61 VSS_5 (power), 62 VDD_7 (power), 63 PE10 (io), 64 PE11 (io), 65 PE12 (io), 66 PE13 (io), 67 PE14 (io), 68 PE15 (io), 69 PB10 (io), 70 PB11 (io), 71 VCAP1 (power), 72 VDD_1 (power), 73 PB12 (io), 74 PB13 (io), 75 PB14 (io), 76 PB15 (io), 77 PD8 (io), 78 PD9 (io), 79 PD10 (io), 80 PD11 (io), 81 PD12 (io), 82 PD13 (io), 83 VSS_6 (power), 84 VDD_8 (power), 85 PD14 (io), 86 PD15 (io), 87 PG2 (io), 88 PG3 (io), 89 PG4 (io), 90 PG5 (io), 91 PG6 (io), 92 PG7 (io), 93 PG8 (io), 94 VSS_7 (power), 95 VDD_9 (power), 96 PC6 (io), 97 PC7 (io), 98 PC8 (io), 99 PC9 (io), 100 PA8 (io), 101 PA9 (io), 102 PA10 (io), 103 PA11 (io), 104 PA12 (io), 105 PA13/JTMS/SWDIO (io), 106 VCAP2, 107 VSS_1 (power), 108 VDD_2 (power), 109 PA14/JTCK/SWCLK (io), 110 PA15/JTDI (io), 111 PC10 (io), 112 PC11 (io), 113 PC12 (io), 114 PD0 (io), 115 PD1 (io), 116 PD2 (io), 117 PD3 (io), 118 PD4 (io), 119 PD5 (io), 120 VSS_8 (power), 121 VDD_10 (power), 122 PD6 (io), 123 PD7 (io), 124 PG9 (io), 125 PG10 (io), 126 PG11 (io), 127 PG12 (io), 128 PG13 (io), 129 PG14 (io), 130 VSS_9 (power), 131 VDD_11 (power), 132 PG15 (io), 133 PB3/JTDO (io), 134 PB4/JNTRST (io), 135 PB5 (io), 136 PB6 (io), 137 PB7 (io), 138 BOOT0 (in), 139 PB8 (io), 140 PB9 (io), 141 PE0 (io), 142 PE1 (io), 143 PDR_ON (power), 144 VDD_3 (power)
text: (dark red pins indicate / non-5V-tolerant I/O)

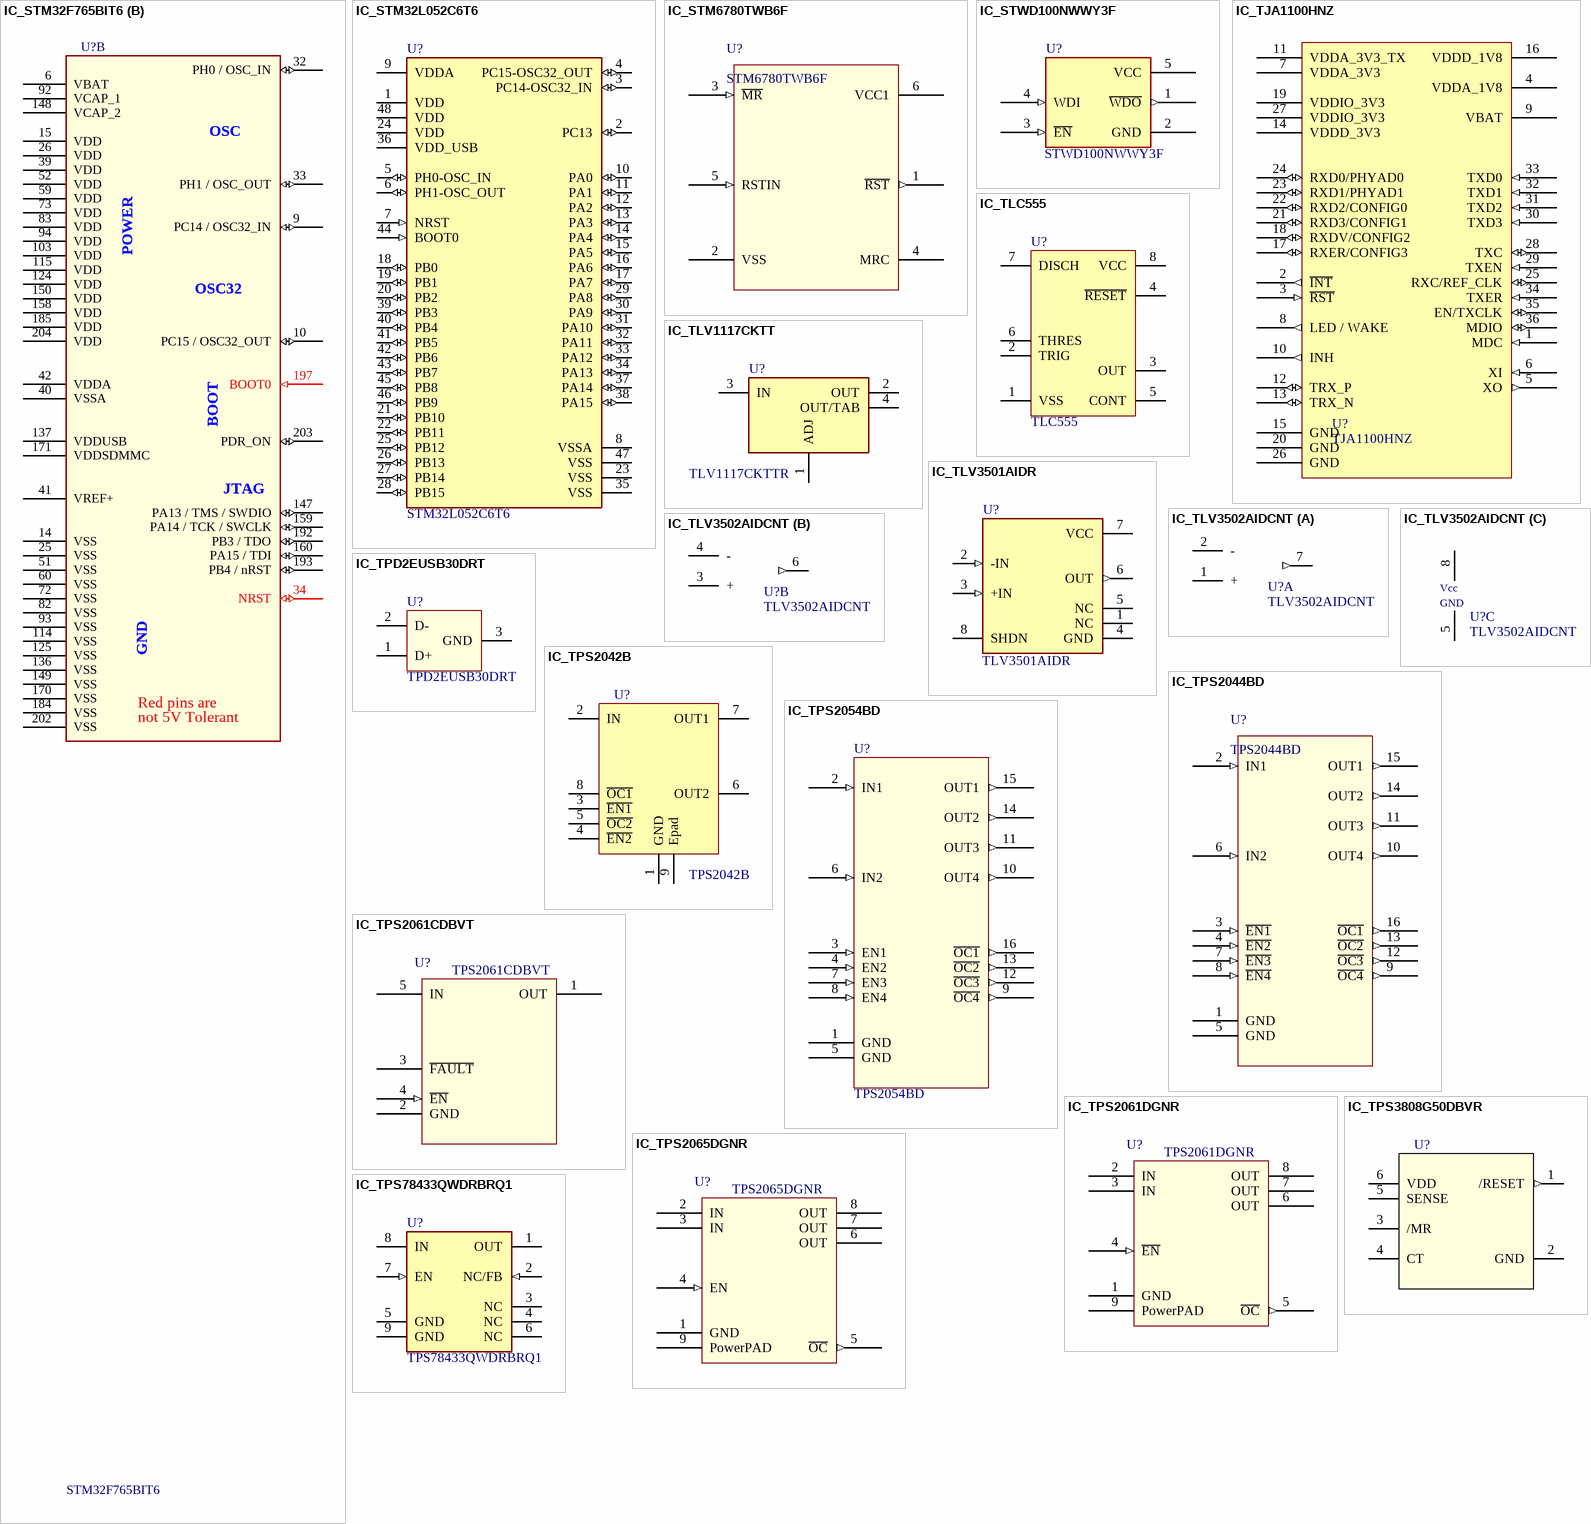
[diagram p26: symbols IC_STM32F765BIT6 to IC_TPS78433QWDRBRQ1]